# Altium footprint library TarabusLib_KOR.PcbLib: 560 footprints (part 1 of 35)
Each footprint in its own frame and in the unit in brackets; x right, y up, seen from the top. Pads: shape width x height; smd on the part's side, far side on the other; paste and mask are expansions set on the pad; w line width, h text height; cw(c..) or ccw(c..) is an arc to the next point about the centre after c.
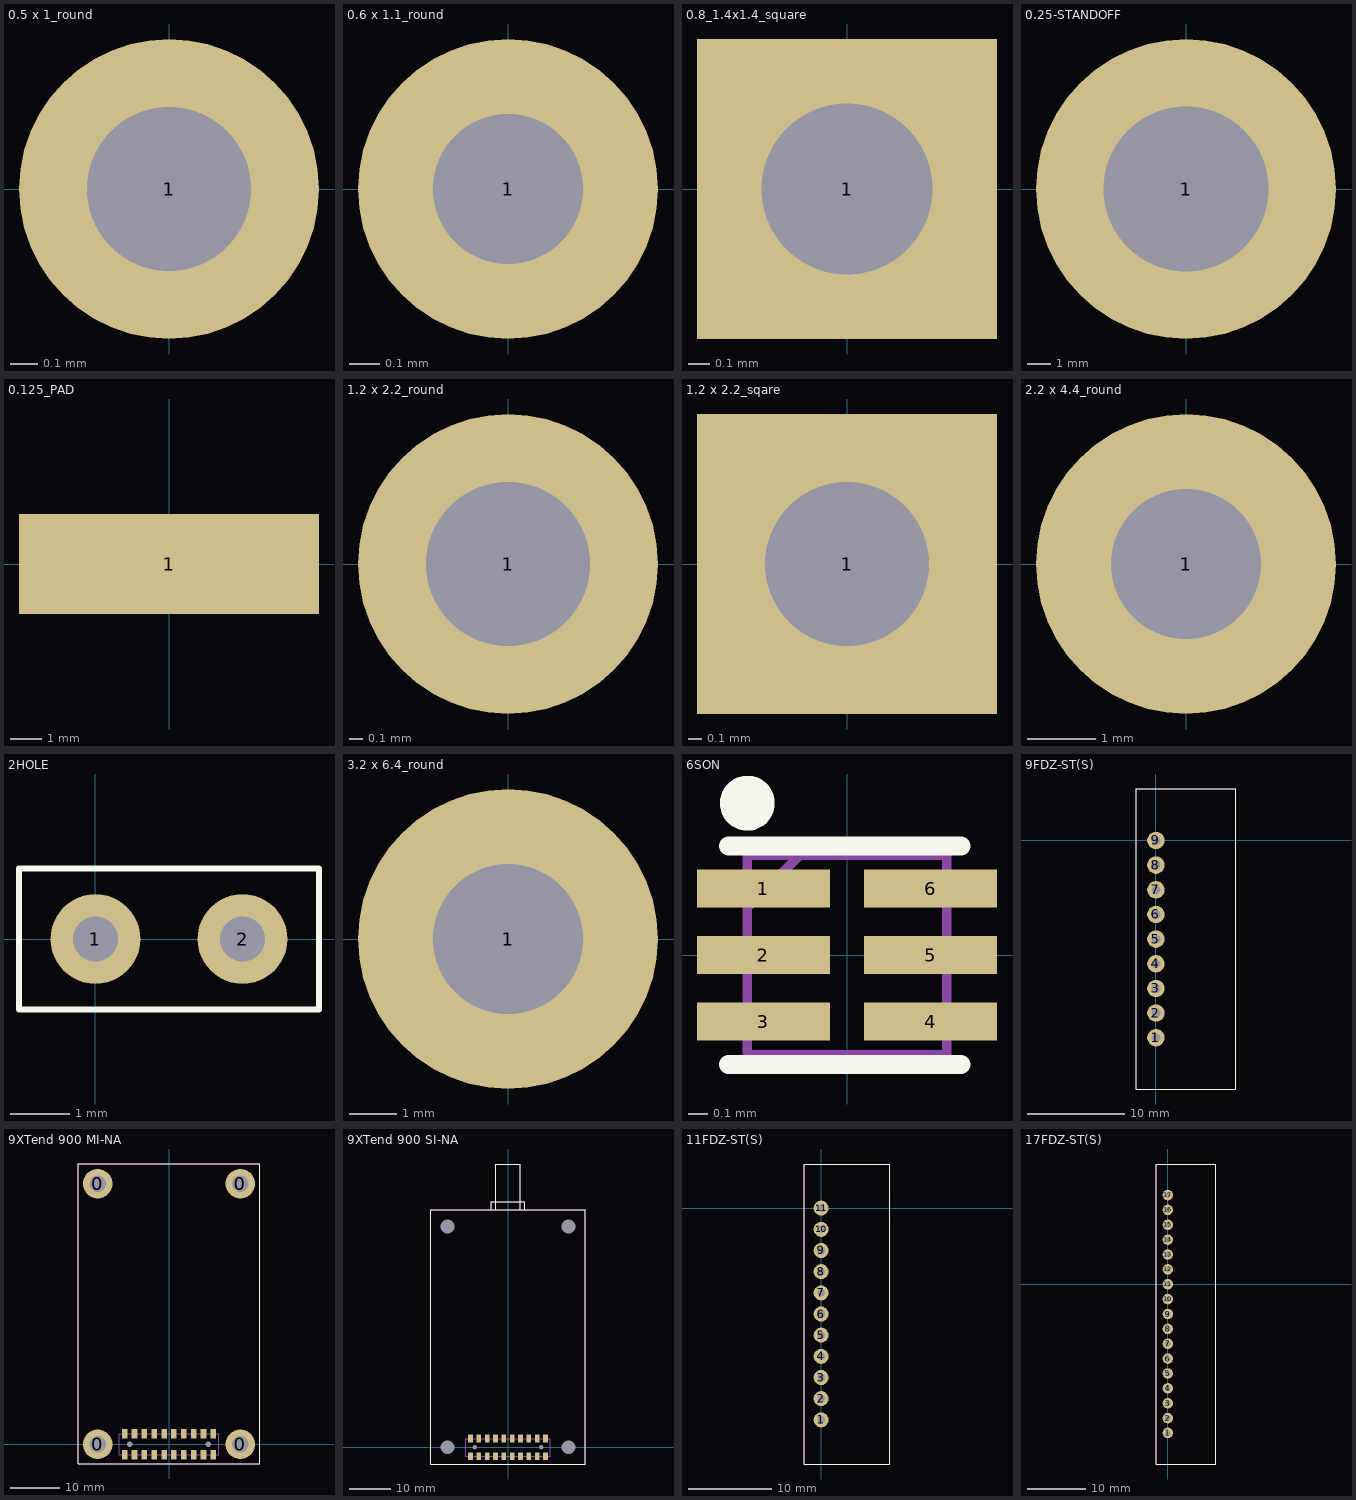
[diagram p0: the footprints below, top view; thin cyan lines are the x and y axes]

## 0.5 x 1_round [mm]
pads (1):
  round 1.1 hole 0.6: 1(0,0)

## 0.6 x 1.1_round [mm]
pads (1):
  round 1 hole 0.5: 1(0,0)

## 0.8_1.4x1.4_square [mm]
pads (1):
  rect 1.4x1.4 hole 0.8: 1(0,0)

## 0.25-STANDOFF [mm]
pads (1):
  round 12.7 hole 6.985: 1(0,0)

## 0.125_PAD [mm]
pads (1):
  rect 9.525x3.175 smd: 1(0,0)

## 1.2 x 2.2_round [mm]
pads (1):
  round 2.2 hole 1.2: 1(0,0)

## 1.2 x 2.2_sqare [mm]
pads (1):
  rect 2.2x2.2 hole 1.2: 1(0,0)

## 2.2 x 4.4_round [mm]
pads (1):
  round 4.4 hole 2.2: 1(0,0)

## 2HOLE [mil]
pads (2):
  round 60 hole 30: 1(0,0) 2(98.43,0)
Top Overlay:
  lines w3.94: -51.18,-47.24 -51.18,-39.37 -51.18,47.24 149.61,47.24 149.61,-47.24 -51.18,-47.24

## 3.2 x 6.4_round [mm]
pads (1):
  round 6.4 hole 3.2: 1(0,0)

## 6SON [mm] "PSON, 6-Leads, Body 3x4 mm, Pitch 0.8mm, NSC Recommended"
height 0.4
pads (6):
  rect 0.7x0.2 smd mask+0.051: 1(-0.44,0.35) 2(-0.44,0) 3(-0.44,-0.35) 4(0.44,-0.35) 5(0.44,0) 6(0.44,0.35)
Top Overlay:
  circle w0.15: c-0.525,0.8 r0.069
  lines w0.1: -0.625,-0.575 0.6,-0.575 ; -0.625,0.575 0.6,0.575
Mechanical 7:
  lines w0.05: -0.513,0.262 -0.25,0.525 -0.2,0.525 ; -0.525,-0.525 0.525,-0.525 0.525,0.525 -0.525,0.525 -0.525,-0.525
Mechanical 9:
  lines w0.05: -0.525,-0.525 -0.525,0.525 0.525,0.525 0.525,-0.525 -0.525,-0.525
Mechanical 10:
  text ".Designator" at -1,-1.125 h0.6
  text ".Comment" at -1,1 h0.6
3D body: height 0.4, standoff 0.05, extent -0.525,-0.525 0.525,0.525

## 9FDZ-ST(S) [mm]
pads (9):
  round 1.8 hole 0.9 mask+0: 1(0,-20.32) 2(0,-17.78) 3(0,-15.24) 4(0,-12.7) 5(0,-10.16) 6(0,-7.62) 7(0,-5.08) 8(0,-2.54) 9(0,0)
Top Overlay:
  lines w0.1: -2,-25.6 8.2,-25.6 8.2,5.3 -2,5.3 -2,-25.6
Mechanical 7:
  lines w0.1: -2,-25.6 -2,5.3 8.2,5.3 8.2,-25.6 -2,-25.6
Mechanical 10:
  text ".Comment" at 4.9,5.7 h0.6
  text ".Designator" at 4.8,6.5 h0.8
3D body: height 7.7, standoff 0, extent -2,-25.6 8.2,5.3

## 9XTend 900 MI-NA [mm]
pads (26):
  round 6 hole 3.3: 0(-14.5,0) 0(-14.5,53) 0(14.5,0) 0(14.5,53)
  round 0.8 hole 1.1: 0(-8,0) 0(8,0)
  rect 1.15x1.9 smd: 1(9,-2.15) 2(9,2.15) 3(7,-2.15) 4(7,2.15) 5(5,-2.15) 6(5,2.15) 7(3,-2.15) 8(3,2.15) 9(1,-2.15) 10(1,2.15) 11(-1,-2.15) 12(-1,2.15) 13(-3,-2.15) 14(-3,2.15) 15(-5,-2.15) 16(-5,2.15) 17(-7,-2.15) 18(-7,2.15) 19(-9,-2.15) 20(-9,2.15)
Top Overlay:
  lines w0.2: -18.5,-4 18.5,-4 18.5,57 -18.5,57 -18.5,-4
Mechanical 9:
  text ".Comment" at -0.9,28.7 h2
  text ".Designator" at 0,26.4 h2
Mechanical 11:
  lines w0.2: -18.5,-4 -18.5,57 18.5,57 18.5,-4 -18.5,-4 ; -10.1,-2.1 10.1,-2.1 10.1,2.1 -10.1,2.1 -10.1,-2.1
3D body "XT09-MI.STEP": height 9.09, standoff 1, extent -18.65,-3.875 18.35,57.176
3D body: height 4.65, standoff 0, extent -10.1,-2.1 10.1,2.1

## 9XTend 900 SI-NA [mm]
pads (26):
  round 1.5 hole 3.3: 0(-14.5,0) 0(-14.5,53) 0(14.5,0) 0(14.5,53)
  round 0.8 hole 1.1: 0(-8,0) 0(8,0)
  rect 1.15x1.9 smd: 1(9,-2.15) 2(9,2.15) 3(7,-2.15) 4(7,2.15) 5(5,-2.15) 6(5,2.15) 7(3,-2.15) 8(3,2.15) 9(1,-2.15) 10(1,2.15) 11(-1,-2.15) 12(-1,2.15) 13(-3,-2.15) 14(-3,2.15) 15(-5,-2.15) 16(-5,2.15) 17(-7,-2.15) 18(-7,2.15) 19(-9,-2.15) 20(-9,2.15)
Top Overlay:
  lines w0.2: -4,57 -4,59 4,59 4,57 ; -18.5,-4 -18.5,57 18.5,57 18.5,-4 -18.5,-4 ; -3,57 3,57 3,68 -3,68 -3,57
Mechanical 9:
  text ".Designator" at 0,26.4 h2
  text ".Comment" at -0.9,28.7 h2
Mechanical 11:
  lines w0.2: -4,57 -4,59 4,59 4,57 ; -18.5,-4 18.5,-4 18.5,57 -18.5,57 -18.5,-4 ; -10.1,-2.1 -10.1,2.1 10.1,2.1 10.1,-2.1 -10.1,-2.1 ; -3,57 -3,68 3,68 3,57 -3,57
3D body: height 11, standoff 3, extent -3.999,57 3.999,59
3D body: height 9.99, standoff 4, extent -2.997,57 3,68
3D body: height 4.65, standoff 0, extent -10.1,-2.1 10.1,2.1
3D body "XT09-MI.STEP": height 9.09, standoff 1, extent -18.5,-4 18.5,57.051

## 11FDZ-ST(S) [mm]
pads (11):
  round 1.8 hole 0.9 mask+0: 1(0,-25.4) 2(0,-22.86) 3(0,-20.32) 4(0,-17.78) 5(0,-15.24) 6(0,-12.7) 7(0,-10.16) 8(0,-7.62) 9(0,-5.08) 10(0,-2.54) 11(0,0)
Top Overlay:
  lines w0.1: -2,-30.7 -2,5.3 8.2,5.3 8.2,-30.7 -2,-30.7
Mechanical 7:
  lines w0.1: -2,-30.7 8.2,-30.7 8.2,5.3 -2,5.3 -2,-30.7
Mechanical 10:
  text ".Comment" at 3.9,5.7 h0.6
  text ".Designator" at 3.8,6.5 h0.8
3D body: height 7.7, standoff 0, extent -2,-30.7 8.2,5.3

## 17FDZ-ST(S) [mm]
pads (17):
  round 1.8 hole 0.9 mask+0: 1(0,-25.4) 2(0,-22.86) 3(0,-20.32) 4(0,-17.78) 5(0,-15.24) 6(0,-12.7) 7(0,-10.16) 8(0,-7.62) 9(0,-5.08) 10(0,-2.54) 11(0,0) 12(0,2.54) 13(0,5.08) 14(0,7.62) 15(0,10.16) 16(0,12.7) 17(0,15.24)
Top Overlay:
  lines w0.1: -2,-30.7 8.2,-30.7 8.2,20.54 -2,20.54 -2,-30.7
Mechanical 7:
  lines w0.1: -2,-30.7 -2,20.54 8.2,20.54 8.2,-30.7 -2,-30.7
Mechanical 10:
  text ".Designator" at 4,21.9 h0.8
  text ".Comment" at 4.1,21.1 h0.6
3D body: height 7.7, standoff 0, extent -2,-30.7 8.2,20.5